# Altium footprint library Pcb-hionyPcbLib.PcbLib: 580 footprints (part 19 of 37)
Each footprint in its own frame and in the unit in brackets; x right, y up, seen from the top. Pads: shape width x height; smd on the part's side, far side on the other; paste and mask are expansions set on the pad; w line width, h text height; cw(c..) or ccw(c..) is an arc to the next point about the centre after c.
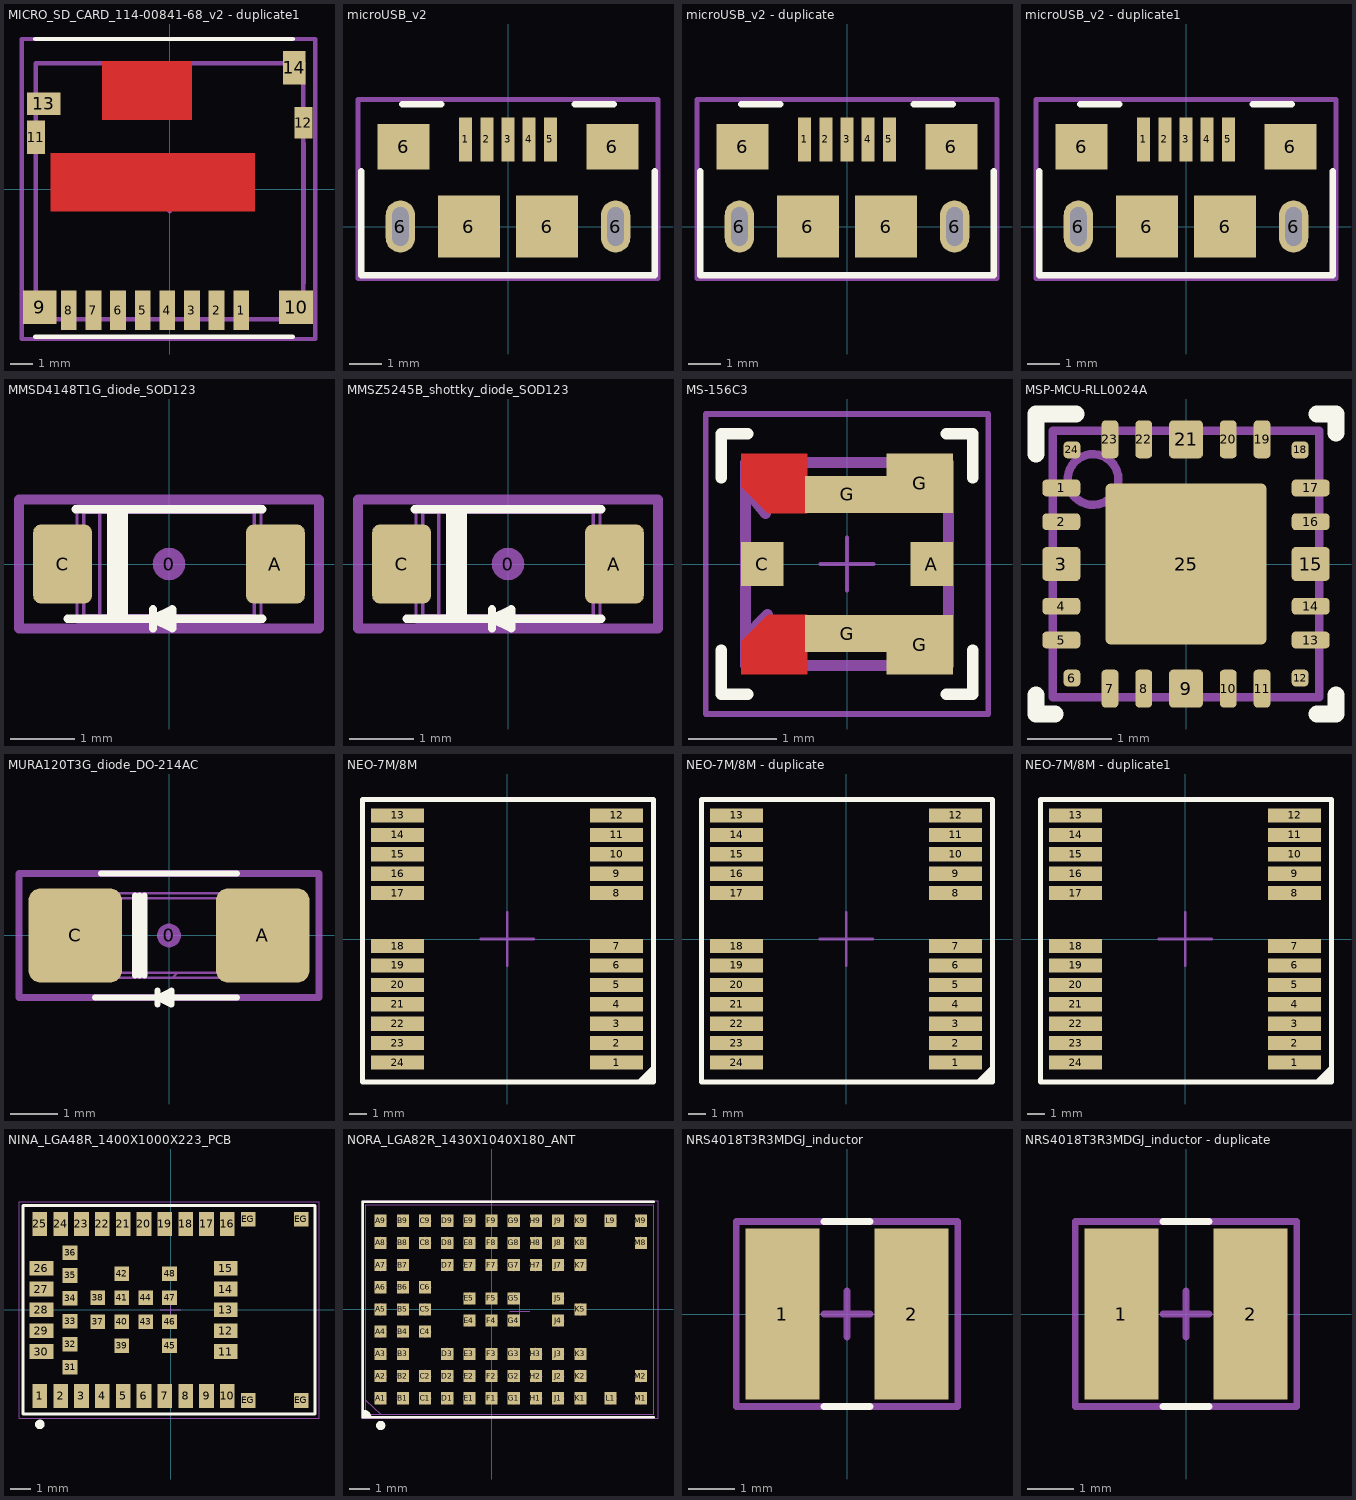
[diagram p18: the footprints below, top view; thin cyan lines are the x and y axes]

## MICRO_SD_CARD_114-00841-68_v2 - duplicate1 [mm]
pads (14):
  rect 0.7x1.75 smd mask+0.1: 1(3.2,-5.412) 6(-2.3,-5.412)
  rect 0.701x1.753 smd mask+0.1: 2(2.1,-5.412) 8(-4.5,-5.412)
  rect 0.701x1.752 smd mask+0.1: 3(1,-5.412) 4(-0.1,-5.412) 5(-1.2,-5.412) 7(-3.4,-5.412)
  rect 1.501x1.501 smd mask+0.1: 9(-5.8,-5.288)
  rect 1.502x1.502 smd mask+0.1: 10(5.65,-5.288)
  rect 0.801x1.501 smd mask+0.1: 11(-5.975,2.312)
  rect 0.8x1.401 smd mask+0.1: 12(5.975,2.963)
  rect 1.5x1 smd mask+0.1: 13(-5.62,3.812)
  rect 1.001x1.502 smd mask+0.1: 14(5.575,5.413)
Top Layer:
  pour cut-out: 3.8,-1 -5.3,-1 -5.3,1.6 3.8,1.6
  pour cut-out: 1,3.1 -3,3.1 -3,5.7 1,5.7
Top Overlay:
  lines w0.2: -6,-6.6 5.5,-6.6 ; -6,6.7 5.5,6.7
Top Solder:
  region: -6.475,3.15 -6.475,4.425 -4.75,4.425 -4.75,3.2 -5.475,3.2 -5.475,3.15
Mechanical 13:
  lines w0.2: -5.975,-5.841 -5.975,5.626 ; -5.975,-5.826 5.976,-5.826 ; -5.975,-4.145 -5.975,-0.109 ; -5.975,-0.104 -5.975,1.237 ; 4.656,5.626 -5.975,5.626 ; 5.982,-5.831 5.982,5.626 ; 5.985,-4.215 5.985,-0.104 ; 5.988,-0.105 5.988,2.043 ; 5.988,5.626 -5.975,5.626
Mechanical 15:
  lines w0.2: -1,0 0,0 ; 0,-1 0,0 ; 0,1 0,0 ; 1,0 0,0 ; -6.6,-6.7 6.5,-6.7 6.5,6.7 -6.6,6.7 -6.6,-6.7
  text ".Designator" at 0.825,1.962 h0.55
  text "1" at 3.325,-4.038 h0.55
  text "8" at -4.225,-4.038 h0.55
3D body "User Library-Micro SD Holder 114-00841-68.step": height 1.6, standoff 0, extent -6,-5.85 6,5.75
3D body "User Library-Micro_SD.step": height 1.45, standoff 0.47, extent -5.5,-9.9 5.5,5.1

## microUSB_v2 [mm]
pads (11):
  rect 0.4x1.35 smd mask+0.05: 1(-1.3,2.675) 2(-0.65,2.675) 3(0,2.675) 4(0.65,2.675) 5(1.3,2.675)
  oval 0.9x1.6 hole 0.5 slot 1.2 at 90 deg: 6(-3.3,0) 6(3.3,0)
  rect 1.6x1.4 smd: 6(-3.2,2.45) 6(3.2,2.45)
  rect 1.9x1.9 smd: 6(-1.2,0) 6(1.2,0)
Top Overlay:
  lines w0.2: -4.5,1.7 -4.5,-1.5 4.5,-1.5 4.5,1.7 ; -3.25,3.75 -2.05,3.75 ; 2.05,3.75 3.25,3.75
Mechanical 15:
  lines w0.15: -4.6,-1.6 -4.6,3.9 4.6,3.9 4.6,-1.6 -4.6,-1.6
  text ".Designator" at 0.65,1.075 h0.55
3D body "USB3090-30-A_revE.step": height 2.59, standoff -1, extent -3.891,-2.565 3.892,2.925

## microUSB_v2 - duplicate [mm]
pads (11):
  rect 0.4x1.35 smd mask+0.05: 1(-1.3,2.675) 2(-0.65,2.675) 3(0,2.675) 4(0.65,2.675) 5(1.3,2.675)
  oval 0.9x1.6 hole 0.5 slot 1.2 at 90 deg: 6(-3.3,0) 6(3.3,0)
  rect 1.6x1.4 smd: 6(-3.2,2.45) 6(3.2,2.45)
  rect 1.9x1.9 smd: 6(-1.2,0) 6(1.2,0)
Top Overlay:
  lines w0.2: -4.5,1.7 -4.5,-1.5 4.5,-1.5 4.5,1.7 ; -3.25,3.75 -2.05,3.75 ; 2.05,3.75 3.25,3.75
Mechanical 15:
  lines w0.15: -4.6,-1.6 4.6,-1.6 4.6,3.9 -4.6,3.9 -4.6,-1.6
  text ".Designator" at 0.65,1.075 h0.55
3D body "USB3090-30-A_revE.step": height 2.59, standoff -1, extent -3.891,-2.565 3.892,2.925

## microUSB_v2 - duplicate1 [mm]
pads (11):
  rect 0.4x1.35 smd mask+0.05: 1(-1.3,2.675) 2(-0.65,2.675) 3(0,2.675) 4(0.65,2.675) 5(1.3,2.675)
  oval 0.9x1.6 hole 0.5 slot 1.2 at 90 deg: 6(-3.3,0) 6(3.3,0)
  rect 1.6x1.4 smd: 6(-3.2,2.45) 6(3.2,2.45)
  rect 1.9x1.9 smd: 6(-1.2,0) 6(1.2,0)
Top Overlay:
  lines w0.2: -4.5,1.7 -4.5,-1.5 4.5,-1.5 4.5,1.7 ; -3.25,3.75 -2.05,3.75 ; 2.05,3.75 3.25,3.75
Mechanical 15:
  lines w0.15: -4.6,-1.6 -4.6,3.9 4.6,3.9 4.6,-1.6 -4.6,-1.6
  text ".Designator" at 0.65,1.075 h0.55
3D body "USB3090-30-A_revE.step": height 2.59, standoff -1, extent -3.891,-2.565 3.892,2.925

## MMSD4148T1G_diode_SOD123 [mm]
pads (3):
  round 0.508 on Mech15: 0(0,0)
  rrect25% 0.91x1.22 smd: A(1.65,0) C(-1.65,0)
Top Overlay:
  lines w0.127: -1.575,-0.85 1.448,-0.85 ; -1.45,0.85 1.45,0.85 ; -0.9,-0.85 -0.9,0.85 ; -0.8,-0.85 -0.8,0.85 ; -0.7,-0.85 -0.7,0.85 ; -0.25,-1 -0.25,-0.7 ; 0.05,-0.85 -0.25,-0.85 ; -0.25,-0.85 0.05,-0.7 0.05,-1 -0.25,-0.85
Mechanical 13:
  lines w0.05: -1.766,-0.308 -1.766,0.308 ; -1.707,-0.308 -1.707,0.308 ; -1.517,-0.308 -1.517,0.308 ; -1.425,-0.308 -1.95,-0.308 -1.95,0.308 -1.425,0.308 ; 0.075,-0.9 0.177,-0.798 ; 1.425,-0.307 1.95,-0.307 1.95,0.307 1.425,0.307 ; 1.517,-0.308 1.517,0.308 ; 1.707,-0.308 1.707,0.308 ; 1.766,-0.308 1.766,0.308 ; -1.425,0.9 -1.425,-0.9 1.425,-0.9 ; -1.425,0.9 1.425,0.9 ; -1.425,0.9 -1.323,0.798 ; -1.323,0.798 -1.323,-0.798 -1.072,-0.798 ; -1.323,0.798 -1.072,0.798 ; -1.072,-0.798 -1.072,0.798 ; -1.072,-0.798 1.322,-0.797 ; -1.072,0.798 1.322,0.797 ; 1.322,-0.797 1.425,-0.9 ; 1.322,-0.797 1.322,0.797 ; 1.322,0.797 1.425,0.9 ; 1.425,-0.9 1.425,0.9
Mechanical 15:
  lines w0.15: -2.325,-1 -2.325,1 2.325,1 2.325,-1 -2.325,-1
  text ".Designator" at 1.025,-0.576 h0.55
  text "C" at -1.375,-0.201 h0.55
  text "A" at 1.95,-0.101 h0.55
3D body "SOD123.STEP": height 1.18, standoff 0, extent -1.95,-0.9 1.95,0.9

## MMSZ5245B_shottky_diode_SOD123 [mm]
pads (3):
  round 0.508 on Mech15: 0(0,0)
  rrect25% 0.91x1.22 smd: A(1.65,0) C(-1.65,0)
Top Overlay:
  lines w0.127: -1.575,-0.85 1.448,-0.85 ; -1.45,0.85 1.45,0.85 ; -0.9,-0.85 -0.9,0.85 ; -0.8,-0.85 -0.8,0.85 ; -0.7,-0.85 -0.7,0.85 ; -0.25,-1 -0.25,-0.7 ; 0.05,-0.85 -0.25,-0.85 ; -0.25,-0.85 0.05,-0.7 0.05,-1 -0.25,-0.85
Mechanical 13:
  lines w0.05: -1.766,-0.308 -1.766,0.308 ; -1.707,-0.308 -1.707,0.308 ; -1.517,-0.308 -1.517,0.308 ; -1.425,-0.307 -1.95,-0.307 -1.95,0.307 -1.425,0.307 ; 0.075,-0.9 0.177,-0.798 ; 1.425,-0.308 1.95,-0.308 1.95,0.308 1.425,0.308 ; 1.517,-0.308 1.517,0.308 ; 1.707,-0.308 1.707,0.308 ; 1.766,-0.308 1.766,0.308 ; -1.425,0.9 -1.425,-0.9 1.425,-0.9 ; -1.425,0.9 1.425,0.9 ; -1.425,0.9 -1.323,0.798 ; -1.323,0.798 -1.323,-0.798 -1.072,-0.798 ; -1.323,0.798 -1.072,0.798 ; -1.072,-0.798 -1.072,0.798 ; -1.072,-0.798 1.322,-0.797 ; -1.072,0.798 1.322,0.797 ; 1.322,-0.797 1.425,-0.9 ; 1.322,-0.797 1.322,0.797 ; 1.322,0.797 1.425,0.9 ; 1.425,-0.9 1.425,0.9
Mechanical 15:
  lines w0.15: -2.325,-1 -2.325,1 2.325,1 2.325,-1 -2.325,-1
  text ".Designator" at -0.446,-0.125 h0.55
  text "C" at -1.571,0.275 h0.55
  text "A" at 2.029,0.225 h0.55
3D body "SOD123.STEP": height 1.18, standoff 0, extent -1.95,-0.9 1.95,0.9

## MS-156C3 [mm]
pads (6):
  rect 0.48x0.5 smd paste-10: A(0.96,0) C(-0.96,0)
  rect 0.95x0.42 smd paste-10 mask+0.102: G(0,-0.79) G(0,0.79)
  rect 0.75x0.67 smd paste-10 mask+0.102: G(0.825,-0.915) G(0.825,0.915)
Top Layer:
  region: -0.45,0.575 -0.9,0.575 -1.2,0.875 -1.2,1.25 -0.45,1.25
  region: -0.45,-0.575 -0.9,-0.575 -1.2,-0.875 -1.2,-1.25 -0.45,-1.25
Top Overlay:
  lines w0.127: -1.425,-0.975 -1.425,-1.475 -1.125,-1.475 ; -1.425,0.975 -1.425,1.475 -1.125,1.475 ; 1.125,-1.475 1.425,-1.475 1.425,-0.975 ; 1.125,1.475 1.425,1.475 1.425,0.975
Top Paste:
  region: -0.5,-1.2 -0.9,-1.2 -0.9,-0.8 -0.5,-0.8
  region: -0.275,-0.95 0.225,-0.95 0.225,-0.65 -0.275,-0.65
  region: 0.5,-1.2 0.9,-1.2 0.9,-0.8 0.5,-0.8
  region: -0.5,1.2 -0.9,1.2 -0.9,0.8 -0.5,0.8
  region: -0.275,0.95 0.225,0.95 0.225,0.65 -0.275,0.65
  region: -1.15,0.2 -0.85,0.2 -0.85,-0.2 -1.15,-0.2
  region: 1.15,0.2 0.85,0.2 0.85,-0.2 1.15,-0.2
  region: 0.5,1.2 0.9,1.2 0.9,0.8 0.5,0.8
Top Solder:
  region: -1.3,0 -1.3,-0.8 1.3,-0.8 1.3,0
  region: -1,-0.475 -1.3,-0.775 -1.3,-1.35 -0.35,-1.35 -0.35,-0.475
  region: -1.3,0 -1.3,0.8 1.3,0.8 1.3,0
  region: -1,0.475 -1.3,0.775 -1.3,1.35 -0.35,1.35 -0.35,0.475
Mechanical 11:
  text ".Designator" at 0.05,0.15 h0.3
Mechanical 13:
  lines w0.05: -0.838,-0.077 cw(c-0.909,-0.006) -0.838,0.065
  lines w0.127: -1.15,-0.825 -0.9,-0.575 ; -1.148,0.847 -0.925,0.575 ; -1.15,-1.15 -1.15,1.15 1.15,1.15 1.15,-1.15 -1.15,-1.15
Mechanical 15:
  lines w0.05: -0.3,0 0.3,0 ; 0,-0.3 0,0.3
  lines w0.064: -1.6,-1.7 -1.6,1.7 1.6,1.7 1.6,-1.7 -1.6,-1.7
3D body "MS-156C3.stp": height 1.36, standoff 0.01, extent -1.15,-1.15 1.15,1.15

## MSP-MCU-RLL0024A [mm]
pads (26):
  rrect50% 0.45x0.2 smd: 1(-1.475,0.9) 2(-1.475,0.5) 4(-1.475,-0.5) 5(-1.475,-0.9) 13(1.475,-0.9) 14(1.475,-0.5) 16(1.475,0.5) 17(1.475,0.9)
  rrect25% 0.45x0.4 smd: 3(-1.475,0) 15(1.475,0)
  rrect50% 0.2x0.2 smd: 6(-1.35,-1.35) 12(1.35,-1.35) 18(1.35,1.35) 24(-1.35,1.35)
  rrect50% 0.2x0.45 smd: 7(-0.9,-1.475) 8(-0.5,-1.475) 10(0.5,-1.475) 11(0.9,-1.475) 19(0.9,1.475) 20(0.5,1.475) 22(-0.5,1.475) 23(-0.9,1.475)
  rrect25% 0.4x0.45 smd: 9(0,-1.475) 21(0,1.475)
  rrect5% 1.9x1.9 smd paste-1.9: 25(0,0)
  rrect50% 1.71x1.71 on Top Paste: ""(0,0)
Top Overlay:
  lines w0.2: -1.775,-1.55 -1.775,-1.775 -1.55,-1.775 ; -1.775,1.3 -1.775,1.775 -1.3,1.775 ; 1.55,-1.775 1.775,-1.775 1.775,-1.55 ; 1.55,1.775 1.775,1.775 1.775,1.55
Top 3D Body:
  circle w0.1: c-1.1,1 r0.3
  lines w0.1: -1.575,-1.575 1.575,-1.575 1.575,1.575 -1.575,1.575 -1.575,-1.575
  text ".Designator" at 0.7,-3.9 h1.52
3D body: height 1.01, standoff 1, extent -1.399,0.701 -0.801,1.299
3D body: height 1, standoff 0.08, extent -1.575,-1.575 1.575,1.575

## MURA120T3G_diode_DO-214AC [mm]
pads (3):
  round 0.508 on Mech15: 0(0,0)
  rrect25% 2x2 smd: A(2,0) C(-2,0)
Top Overlay:
  lines w0.127: -1.575,-1.325 1.448,-1.325 ; -1.45,1.325 1.45,1.325 ; -0.725,-0.85 -0.725,0.85 ; -0.625,-0.85 -0.625,0.85 ; -0.525,-0.85 -0.525,0.85 ; -0.25,-1.475 -0.25,-1.175 ; 0.05,-1.325 -0.25,-1.325 ; -0.25,-1.325 0.05,-1.175 0.05,-1.475 -0.25,-1.325
Mechanical 13:
  lines w0.05: -1.766,-0.308 -1.766,0.308 ; -1.707,-0.308 -1.707,0.308 ; -1.517,-0.308 -1.517,0.308 ; -1.425,-0.308 -1.95,-0.308 -1.95,0.308 -1.425,0.308 ; 0.075,-0.9 0.177,-0.798 ; 1.425,-0.308 1.95,-0.308 1.95,0.308 1.425,0.308 ; 1.517,-0.308 1.517,0.308 ; 1.707,-0.308 1.707,0.308 ; 1.766,-0.308 1.766,0.308 ; -1.425,0.9 -1.425,-0.9 1.425,-0.9 ; -1.425,0.9 1.425,0.9 ; -1.425,0.9 -1.323,0.798 ; -1.323,0.798 -1.323,-0.798 -1.072,-0.798 ; -1.323,0.798 -1.072,0.798 ; -1.072,-0.798 -1.072,0.798 ; -1.072,-0.798 1.322,-0.797 ; -1.072,0.798 1.322,0.797 ; 1.322,-0.797 1.425,-0.9 ; 1.322,-0.797 1.322,0.797 ; 1.322,0.797 1.425,0.9 ; 1.425,-0.9 1.425,0.9
Mechanical 15:
  lines w0.15: -3.2,-1.325 -3.2,1.325 3.2,1.325 3.2,-1.325 -3.2,-1.325
  text ".Designator" at -0.425,0.4 h0.55
  text "C" at -1.9,-0.275 h0.55
  text "A" at 1.475,-0.275 h0.55
3D body "User Library-DO-214AC SMA.SLDPRT": height 2.4, standoff 0, extent -2.6,-1.3 2.6,1.3

## NEO-7M/8M [mm]
pads (24):
  rect 3x0.8 smd: 1(6.2,-7) 2(6.2,-5.9) 3(6.2,-4.8) 4(6.2,-3.7) 5(6.2,-2.6) 6(6.2,-1.5) 7(6.2,-0.4) 8(6.2,2.6) 9(6.2,3.7) 10(6.2,4.8) 11(6.2,5.9) 12(6.2,7) 13(-6.2,7) 14(-6.2,5.9) 15(-6.2,4.8) 16(-6.2,3.7) 17(-6.2,2.6) 18(-6.2,-0.4) 19(-6.2,-1.5) 20(-6.2,-2.6) 21(-6.2,-3.7) 22(-6.2,-4.8) 23(-6.2,-5.9) 24(-6.2,-7)
Top Overlay:
  region: 7.5,-8.1 8.3,-7.3 8.3,-8.1
  lines w0.3: 7.5,-8.1 8.3,-7.3 ; -8.2,-8.1 -8.2,7.9 8.3,7.9 8.3,-8.1 -8.2,-8.1
Mechanical 15:
  circle w0.4: c6.2,-7 r0.1
  lines w0.15: -1.5,0 1.5,0 ; 0,-1.5 0,1.5 ; -8.2,-8.1 -8.2,7.9 8.3,7.9 8.3,-8.1 -8.2,-8.1
  text ".Designator" at -0.953,-2.85 h0.55
3D body "NEO.STEP": height 2.33, standoff 0, extent -6.1,-8 6.1,8

## NEO-7M/8M - duplicate [mm]
pads (24):
  rect 3x0.8 smd: 1(6.2,-7) 2(6.2,-5.9) 3(6.2,-4.8) 4(6.2,-3.7) 5(6.2,-2.6) 6(6.2,-1.5) 7(6.2,-0.4) 8(6.2,2.6) 9(6.2,3.7) 10(6.2,4.8) 11(6.2,5.9) 12(6.2,7) 13(-6.2,7) 14(-6.2,5.9) 15(-6.2,4.8) 16(-6.2,3.7) 17(-6.2,2.6) 18(-6.2,-0.4) 19(-6.2,-1.5) 20(-6.2,-2.6) 21(-6.2,-3.7) 22(-6.2,-4.8) 23(-6.2,-5.9) 24(-6.2,-7)
Top Overlay:
  region: 7.5,-8.1 8.3,-7.3 8.3,-8.1
  lines w0.3: 7.5,-8.1 8.3,-7.3 ; -8.2,-8.1 -8.2,7.9 8.3,7.9 8.3,-8.1 -8.2,-8.1
Mechanical 15:
  circle w0.4: c6.2,-7 r0.1
  lines w0.15: -1.5,0 1.5,0 ; 0,-1.5 0,1.5 ; -8.2,-8.1 -8.2,7.9 8.3,7.9 8.3,-8.1 -8.2,-8.1
  text ".Designator" at -0.953,-2.85 h0.55
3D body "NEO.STEP": height 2.33, standoff 0, extent -6.1,-8 6.1,8

## NEO-7M/8M - duplicate1 [mm]
pads (24):
  rect 3x0.8 smd: 1(6.2,-7) 2(6.2,-5.9) 3(6.2,-4.8) 4(6.2,-3.7) 5(6.2,-2.6) 6(6.2,-1.5) 7(6.2,-0.4) 8(6.2,2.6) 9(6.2,3.7) 10(6.2,4.8) 11(6.2,5.9) 12(6.2,7) 13(-6.2,7) 14(-6.2,5.9) 15(-6.2,4.8) 16(-6.2,3.7) 17(-6.2,2.6) 18(-6.2,-0.4) 19(-6.2,-1.5) 20(-6.2,-2.6) 21(-6.2,-3.7) 22(-6.2,-4.8) 23(-6.2,-5.9) 24(-6.2,-7)
Top Overlay:
  region: 7.5,-8.1 8.3,-7.3 8.3,-8.1
  lines w0.3: 7.5,-8.1 8.3,-7.3 ; -8.2,-8.1 -8.2,7.9 8.3,7.9 8.3,-8.1 -8.2,-8.1
Mechanical 15:
  circle w0.4: c6.2,-7 r0.1
  lines w0.15: -1.5,0 1.5,0 ; 0,-1.5 0,1.5 ; -8.2,-8.1 -8.2,7.9 8.3,7.9 8.3,-8.1 -8.2,-8.1
  text ".Designator" at -0.953,-2.85 h0.55
3D body "NEO.STEP": height 2.33, standoff 0, extent -6.1,-8 6.1,8

## NINA_LGA48R_1400X1000X223_PCB [mm]
pads (52):
  rect 0.7x1.15 smd paste+0 mask+0.05: 1(-6.275,-4.125) 2(-5.275,-4.125) 3(-4.275,-4.125) 4(-3.275,-4.125) 5(-2.275,-4.125) 6(-1.275,-4.125) 7(-0.275,-4.125) 8(0.725,-4.125) 9(1.725,-4.125) 10(2.725,-4.125) 16(2.725,4.125) 17(1.725,4.125) 18(0.725,4.125) 19(-0.275,4.125) 20(-1.275,4.125) 21(-2.275,4.125) 22(-3.275,4.125) 23(-4.275,4.125) 24(-5.275,4.125) 25(-6.275,4.125)
  rect 1.15x0.7 smd paste+0 mask+0.05: 11(2.65,-2) 12(2.65,-1) 13(2.65,0) 14(2.65,1) 15(2.65,2) 26(-6.2,2) 27(-6.2,1) 28(-6.2,0) 29(-6.2,-1) 30(-6.2,-2)
  rect 0.7x0.7 smd paste+0 mask+0.05: 31(-4.825,-2.75) 32(-4.825,-1.65) 33(-4.825,-0.55) 34(-4.825,0.55) 35(-4.825,1.65) 36(-4.825,2.75) 37(-3.5,-0.575) 38(-3.5,0.575) 39(-2.35,-1.725) 40(-2.35,-0.575) 41(-2.35,0.575) 42(-2.35,1.725) 43(-1.2,-0.575) 44(-1.2,0.575) 45(-0.05,-1.725) 46(-0.05,-0.575) 47(-0.05,0.575) 48(-0.05,1.725) EG(3.725,-4.35) EG(3.725,4.35) EG(6.275,-4.35) EG(6.275,4.35)
Top Overlay:
  circle w0.254: c-6.275,-5.5 r0.1
  lines w0.15: -7.075,-5 6.925,-5 6.925,5 -7.075,5 -7.075,-5
Mechanical 13:
  lines w0.1: -7.075,-5 6.925,-5 6.925,5 -7.075,5 -7.075,-5
Mechanical 15:
  lines w0.05: -0.5,0 0.5,0 ; 0,-0.5 0,0.5 ; -7.275,-5.2 7.125,-5.2 7.125,5.2 -7.275,5.2 -7.275,-5.2
  text ".Designator" at 0.1,0.433 h1
Multi-Layer:
  pour cut-out: 3.825,4 6.925,4 6.925,-4 3.825,-4
3D body "NINA-W1x6.STEP": height 2.25, standoff -0.01, extent -7.075,-5 6.925,5

## NORA_LGA82R_1430X1040X180_ANT [mm]
pads (82):
  rect 0.6x0.6 smd: A1(-5.5,-4.4) A2(-5.5,-3.3) A3(-5.5,-2.2) A4(-5.5,-1.1) A5(-5.5,0) A6(-5.5,1.1) A7(-5.5,2.2) A8(-5.5,3.3) A9(-5.5,4.4) B1(-4.4,-4.4) B2(-4.4,-3.3) B3(-4.4,-2.2) B4(-4.4,-1.1) B5(-4.4,0) B6(-4.4,1.1) B7(-4.4,2.2) B8(-4.4,3.3) B9(-4.4,4.4) C1(-3.3,-4.4) C2(-3.3,-3.3) C4(-3.3,-1.1) C5(-3.3,0) C6(-3.3,1.1) C8(-3.3,3.3) C9(-3.3,4.4) D1(-2.2,-4.4) D2(-2.2,-3.3) D3(-2.2,-2.2) D7(-2.2,2.2) D8(-2.2,3.3) D9(-2.2,4.4) E1(-1.1,-4.4) E2(-1.1,-3.3) E3(-1.1,-2.2) E4(-1.1,-0.55) E5(-1.1,0.55) E7(-1.1,2.2) E8(-1.1,3.3) E9(-1.1,4.4) F1(0,-4.4) F2(0,-3.3) F3(0,-2.2) F4(0,-0.55) F5(0,0.55) F7(0,2.2) F8(0,3.3) F9(0,4.4) G1(1.1,-4.4) G2(1.1,-3.3) G3(1.1,-2.2) G4(1.1,-0.55) G5(1.1,0.55) G7(1.1,2.2) G8(1.1,3.3) G9(1.1,4.4) H1(2.2,-4.4) H2(2.2,-3.3) H3(2.2,-2.2) H7(2.2,2.2) H8(2.2,3.3) H9(2.2,4.4) J1(3.3,-4.4) J2(3.3,-3.3) J3(3.3,-2.2) J4(3.3,-0.55) J5(3.3,0.55) J7(3.3,2.2) J8(3.3,3.3) J9(3.3,4.4) K1(4.4,-4.4) K2(4.4,-3.3) K3(4.4,-2.2) K5(4.4,0) K7(4.4,2.2) K8(4.4,3.3) K9(4.4,4.4) L1(5.9,-4.4) L9(5.9,4.4) M1(7.4,-4.4) M2(7.4,-3.3) M8(7.4,3.3) M9(7.4,4.4)
Top Overlay:
  circle w0.254: c-5.5,-5.75 r0.1
  lines w0.127: 8.05,-5.35 -6.4,-5.35 -6.4,5.35 8.05,5.35
  lines w0.128: -6.343,-5.194 -6.193,-5.344 ; -6.3,-5.15 cw(c-6.3,-5.3) -6.15,-5.3 ; -6.3,-5.05 cw(c-6.325,-5.349) -6.025,-5.349
Mechanical 11:
  text ".Designator" at -1.075,-0.775 h0.5
Mechanical 13:
  lines w0.05: -6.25,-4.5 -5.5,-5.2 ; -6.25,-5.2 -6.25,5.2 8.05,5.2 8.05,-5.2 -6.25,-5.2
Mechanical 14:
  drawing of 328 lines, arcs and shapes, not listed
Mechanical 15:
  lines w0.05: 0.9,-0.1 1.9,-0.1 ; 1.4,-0.6 1.4,0.4 ; -6.45,-5.4 8.25,-5.4 8.25,5.4 -6.45,5.4 -6.45,-5.4
Mechanical 16:
  drawing of 492 lines, arcs and shapes, not listed
Multi-Layer:
  pour cut-out: 7.1,-4.1 7.1,-3.001 7.9,-2.998 7.9,-5.225 8.25,-5.225 8.25,5.325 7.9,5.325 7.9,3 7.1,3 7.1,4.1 4.7,4.1 4.7,-4.1
3D body "NORA-B506_v1.step": height 1.78, standoff -0.01, extent -6.25,-5.2 8.05,5.2

## NRS4018T3R3MDGJ_inductor [mm]
pads (2):
  rect 1.6x3.7 smd mask+0.05: 1(-1.4,0) 2(1.4,0)
Top Overlay:
  lines w0.15: -0.5,-2 0.5,-2 ; -0.5,2 0.5,2
Mechanical 15:
  lines w0.15: -0.5,0 0.5,0 ; 0,-0.5 0,0.5 ; -2.4,-2 2.4,-2 2.4,2 -2.4,2 -2.4,-2
  text "No polarity" at -1.6,-1.7 h0.3
  text ".Designator" at -0.75,0.65 h0.55
3D body "User Library-nr3015_4x4.STEP": height 1.89, standoff -0.11, extent -2,-1.998 2.001,2.002

## NRS4018T3R3MDGJ_inductor - duplicate [mm]
pads (2):
  rect 1.6x3.7 smd mask+0.05: 1(-1.4,0) 2(1.4,0)
Top Overlay:
  lines w0.15: -0.5,-2 0.5,-2 ; -0.5,2 0.5,2
Mechanical 15:
  lines w0.15: -0.5,0 0.5,0 ; 0,-0.5 0,0.5 ; -2.4,-2 2.4,-2 2.4,2 -2.4,2 -2.4,-2
  text ".Designator" at -0.75,0.65 h0.55
  text "No polarity" at -1.6,-1.7 h0.3
3D body "User Library-nr3015_4x4.STEP": height 1.89, standoff -0.11, extent -2,-1.998 2.001,2.002